# Altium footprint library PCBLIB.PcbLib: 557 footprints (part 33 of 36)
Each footprint in its own frame and in the unit in brackets; x right, y up, seen from the top. Pads: shape width x height; smd on the part's side, far side on the other; paste and mask are expansions set on the pad; w line width, h text height; cw(c..) or ccw(c..) is an arc to the next point about the centre after c.
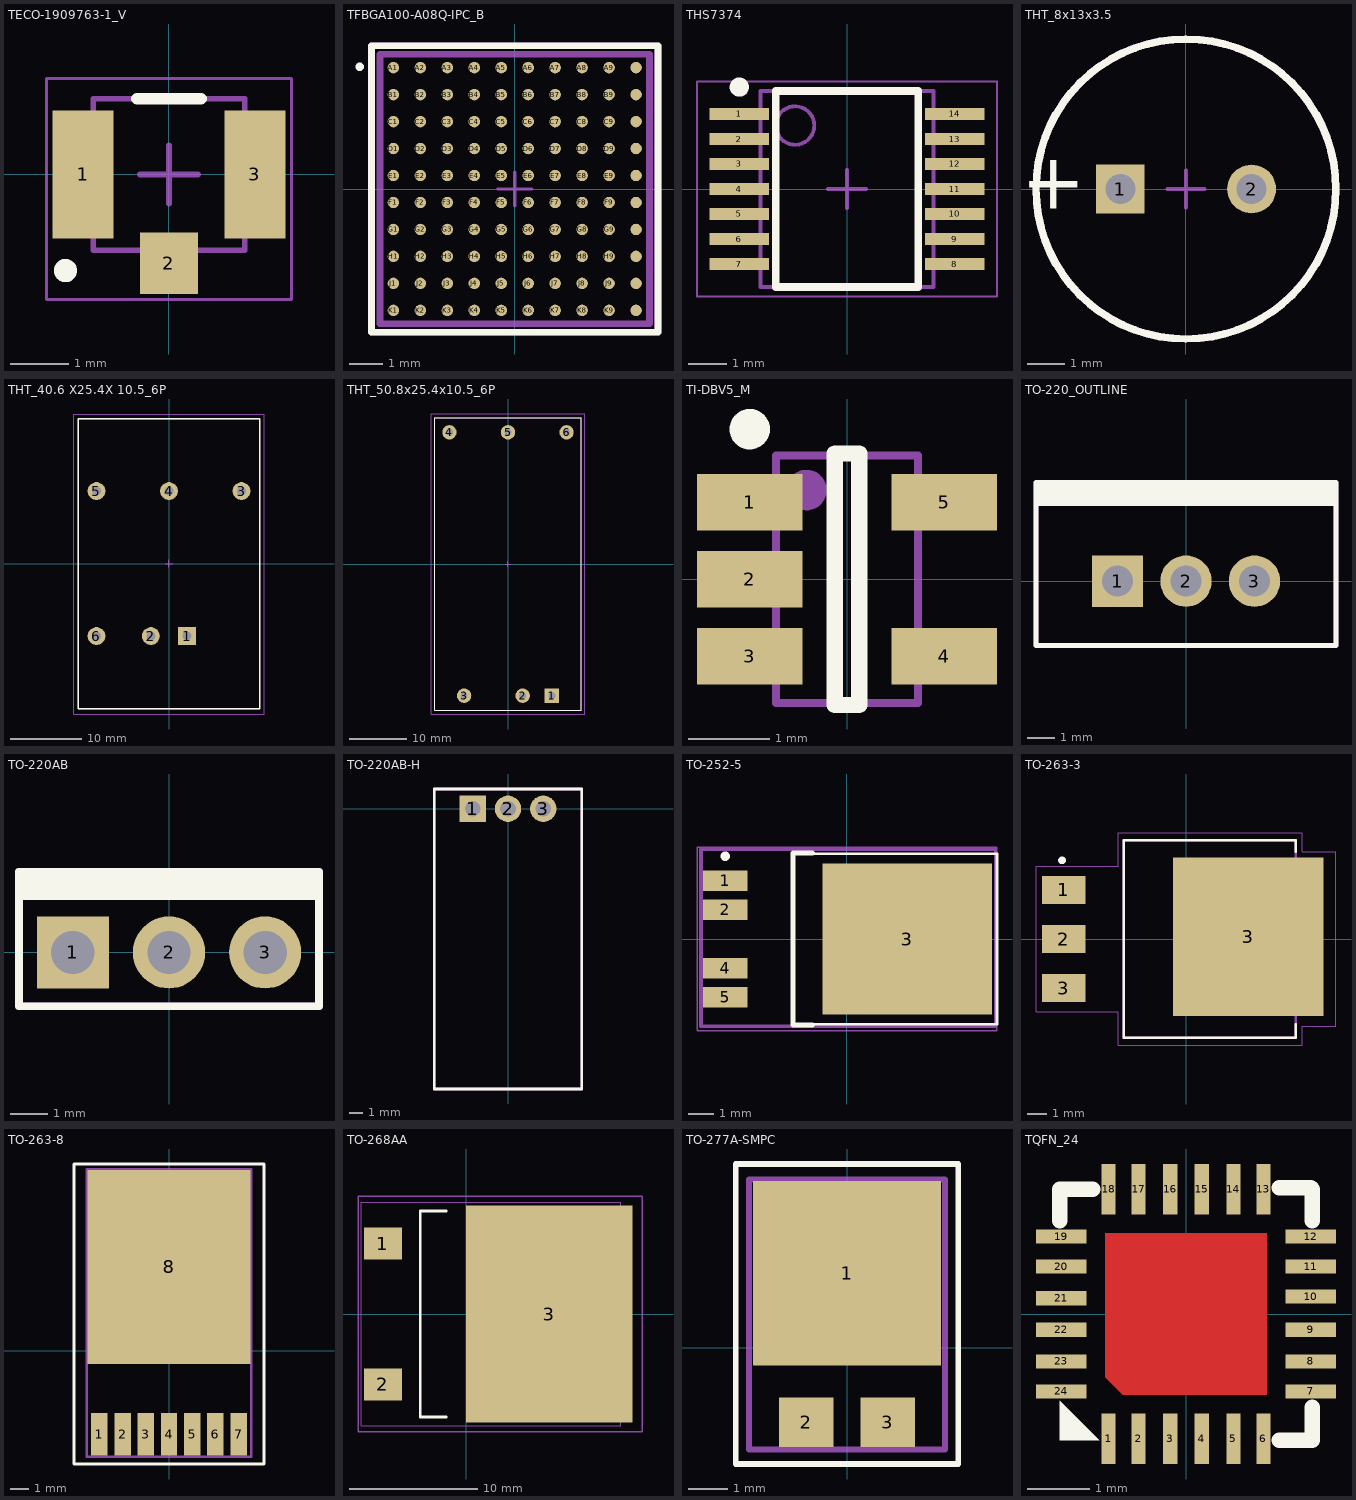
[diagram p32: the footprints below, top view; thin cyan lines are the x and y axes]

## TECO-1909763-1_V [mm] "SMD, 3-Leads, Body 2.6x2.6mm, Height 1.25mm"
height 1.25
pads (3):
  rect 1.05x2.2 smd: 1(-1.475,0) 3(1.475,0)
  rect 1x1.05 smd: 2(0,-1.525)
Top Overlay:
  circle w0.2: c-1.778,-1.65 r0.1
  lines w0.2: -0.55,1.3 0.55,1.3
Mechanical 15:
  lines w0.05: -2.1,-2.15 -2.1,1.65 2.1,1.65 2.1,-2.15 -2.1,-2.15
  lines w0.1: -0.5,0 0.5,0 ; 0,-0.5 0,0.5
ASM Top:
  lines w0.1: -1.3,-1.3 1.3,-1.3 1.3,1.3 -1.3,1.3 -1.3,-1.3
  text ".designator" at 0,0 h0.8
3D body "c-1909763-1-b-3d.stp": height 1.23, standoff 0, extent -1.5,-1.55 1.5,1.55

## TFBGA100-A08Q-IPC_B [mm]
pads (100):
  round 0.34 smd paste+0 mask+0.03: A1(-3.6,3.6) A2(-2.8,3.6) A3(-2,3.6) A4(-1.2,3.6) A5(-0.4,3.6) A6(0.4,3.6) A7(1.2,3.6) A8(2,3.6) A9(2.8,3.6) A10(3.6,3.6) B1(-3.6,2.8) B2(-2.8,2.8) B3(-2,2.8) B4(-1.2,2.8) B5(-0.4,2.8) B6(0.4,2.8) B7(1.2,2.8) B8(2,2.8) B9(2.8,2.8) B10(3.6,2.8) C1(-3.6,2) C2(-2.8,2) C3(-2,2) C4(-1.2,2) C5(-0.4,2) C6(0.4,2) C7(1.2,2) C8(2,2) C9(2.8,2) C10(3.6,2) D1(-3.6,1.2) D2(-2.8,1.2) D3(-2,1.2) D4(-1.2,1.2) D5(-0.4,1.2) D6(0.4,1.2) D7(1.2,1.2) D8(2,1.2) D9(2.8,1.2) D10(3.6,1.2) E1(-3.6,0.4) E2(-2.8,0.4) E3(-2,0.4) E4(-1.2,0.4) E5(-0.4,0.4) E6(0.4,0.4) E7(1.2,0.4) E8(2,0.4) E9(2.8,0.4) E10(3.6,0.4) F1(-3.6,-0.4) F2(-2.8,-0.4) F3(-2,-0.4) F4(-1.2,-0.4) F5(-0.4,-0.4) F6(0.4,-0.4) F7(1.2,-0.4) F8(2,-0.4) F9(2.8,-0.4) F10(3.6,-0.4) G1(-3.6,-1.2) G2(-2.8,-1.2) G3(-2,-1.2) G4(-1.2,-1.2) G5(-0.4,-1.2) G6(0.4,-1.2) G7(1.2,-1.2) G8(2,-1.2) G9(2.8,-1.2) G10(3.6,-1.2) H1(-3.6,-2) H2(-2.8,-2) H3(-2,-2) H4(-1.2,-2) H5(-0.4,-2) H6(0.4,-2) H7(1.2,-2) H8(2,-2) H9(2.8,-2) H10(3.6,-2) J1(-3.6,-2.8) J2(-2.8,-2.8) J3(-2,-2.8) J4(-1.2,-2.8) J5(-0.4,-2.8) J6(0.4,-2.8) J7(1.2,-2.8) J8(2,-2.8) J9(2.8,-2.8) J10(3.6,-2.8) K1(-3.6,-3.6) K2(-2.8,-3.6) K3(-2,-3.6) K4(-1.2,-3.6) K5(-0.4,-3.6) K6(0.4,-3.6) K7(1.2,-3.6) K8(2,-3.6) K9(2.8,-3.6) K10(3.6,-3.6)
Top Overlay:
  circle w0.15: c-4.6,3.625 r0.05
  lines w0.2: -4.25,-4.25 4.25,-4.25 4.25,4.25 -4.25,4.25 -4.25,-4.25
Mechanical 15:
  lines w0.1: -0.5,0 0.5,0 ; 0,-0.5 0,0.5
  lines w0.2: -4.25,-4.25 4.25,-4.25 4.25,4.25 -4.25,4.25 -4.25,-4.25
ASM Top:
  lines w0.2: -4,-4 4,-4 4,4 -4,4 -4,-4
  text ".designator" at 0,0.188 h0.8
3D body "IC_STMicroelectronics_STM32H743VIH6_eec.STEP": height 1.1, standoff 0.3, extent -3.999,-4 4.001,4

## THS7374 [mm] "TSOP, 14-Leads, Body 5,00x4,40mm, Pitch 0,65mm, IPC Medium Density"
height 1.2
pads (14):
  rect 1.55x0.3 smd: 1(-2.8,1.95) 2(-2.8,1.3) 3(-2.8,0.65) 4(-2.8,0) 5(-2.8,-0.65) 6(-2.8,-1.3) 7(-2.8,-1.95) 8(2.8,-1.95) 9(2.8,-1.3) 10(2.8,-0.65) 11(2.8,0) 12(2.8,0.65) 13(2.8,1.3) 14(2.8,1.95)
Top Overlay:
  circle w0.25: c-2.8,2.65 r0.125
  lines w0.2: -1.85,-2.55 1.85,-2.55 1.85,2.55 -1.85,2.55 -1.85,-2.55
Mechanical 15:
  lines w0.05: -3.9,-2.8 3.9,-2.8 3.9,2.8 -3.9,2.8 -3.9,-2.8
  lines w0.1: -0.5,0 0.5,0 ; 0,-0.5 0,0.5
ASM Top:
  circle w0.1: c-1.35,1.65 r0.5
  lines w0.1: -2.25,-2.55 2.25,-2.55 2.25,2.55 -2.25,2.55 -2.25,-2.55
  text ".designator" at -2.025,-0.15 h0.8
3D body "THS7374.step": height 1.2, standoff 0, extent -3.2,-2.55 3.2,2.55

## THT_8x13x3.5 [mm]
height 13
pads (2):
  rect 1.3x1.3 hole 0.8: 1(-1.75,0)
  round 1.3 hole 0.8: 2(1.75,0)
Top Overlay:
  circle w0.2: c0,0 r4
  text "+" at -2.667,0.762 h1.5
Mechanical 13:
  circle w0.05: c0,0 r4
Mechanical 15:
  circle w0.05: c0,0 r4
  lines w0.1: -0.5,0 0.5,0 ; 0,-0.5 0,0.5
ASM Top:
  circle w0.2: c0,0 r4
  text "+" at -2.667,0.762 h1.5
  text ".designator" at -2.3,-0.4 h0.8
3D body "8x16x3.5x0.5.stp": height 16.31, standoff -19.91, extent -4,-3.999 3.99,4

## THT_40.6 X25.4X 10.5_6P [mm]
height 10.5
pads (6):
  rect 2.5x2.5 hole 1.25: 1(2.54,-10.16)
  round 2.5 hole 1.25: 2(-2.54,-10.16) 3(10.16,10.16) 4(0,10.16) 5(-10.16,10.16) 6(-10.16,-10.16)
Top Overlay:
  lines w0.2: -12.7,-20.32 12.7,-20.32 12.7,20.32 -12.7,20.32 -12.7,-20.32
Mechanical 13:
  lines w0.127: -12.7,-20.32 -12.7,20.32 12.7,20.32 12.7,-20.32 -12.7,-20.32
Mechanical 15:
  lines w0.127: -0.5,0 0.5,0 ; 0,-0.5 0,0.5 ; -13.335,-21.082 13.335,-21.082 13.335,20.955 -13.335,20.955 -13.335,-21.082
ASM Top:
  lines w0.127: -12.7,-20.32 12.7,-20.32 12.7,20.32 -12.7,20.32 -12.7,-20.32
  text ".designator" at -0.199,0 h0.8
3D body "JTD15.STEP": height 11, standoff -5.9, extent -12.7,-20.32 12.7,20.32

## THT_50.8x25.4x10.5_6P [mm]
height 10.5
pads (6):
  rect 2.5x2.5 hole 1.25: 1(7.62,-22.86)
  round 2.5 hole 1.25: 2(2.54,-22.86) 3(-7.62,-22.86) 4(-10.16,22.86) 5(0,22.86) 6(10.16,22.86)
Top Overlay:
  lines w0.2: -12.7,-25.4 -12.7,25.4 12.7,25.4 12.7,-25.4 -12.7,-25.4
Mechanical 13:
  lines w0.127: -12.7,-25.4 12.7,-25.4 12.7,25.4 -12.7,25.4 -12.7,-25.4
Mechanical 15:
  lines w0.127: -0.5,0 0.5,0 ; 0,-0.5 0,0.5 ; -13.335,-26.035 -13.335,26.035 13.335,26.035 13.335,-26.035 -13.335,-26.035
ASM Top:
  lines w0.2: -12.7,-25.4 12.7,-25.4 12.7,25.4 -12.7,25.4 -12.7,-25.4
  text ".designator" at -1.1,-0.4 h0.8
3D body "THT_50.8x25.4x10.5_6P.step": height 11.8, standoff -4.1, extent -12.7,-25.4 12.7,25.4

## TI-DBV5_M [mm] "SOT23, 5-Leads, Body 2.9x1.6mm, Pitch 0.95mm, IPC Low Density"
height 1.45
pads (5):
  rect 1.3x0.7 smd: 1(-1.2,0.95) 2(-1.2,0) 3(-1.2,-0.95) 4(1.2,-0.95) 5(1.2,0.95)
Top Overlay:
  circle w0.25: c-1.2,1.85 r0.125
  lines w0.2: -0.15,-1.55 0.15,-1.55 0.15,1.55 -0.15,1.55 -0.15,-1.55
ASM Top:
  circle w0.25: c-0.5,1.1 r0.125
  lines w0.1: -0.875,-1.525 0.875,-1.525 0.875,1.525 -0.875,1.525 -0.875,-1.525
  text ".designator" at 0,0 h0.8
3D body "SOT23-5-2.STEP": height 1.45, standoff 0, extent -1.4,-1.45 1.4,1.45

## TO-220_OUTLINE [mil]
pads (3):
  rect 75x75 hole 45 mask+0: 1(-100,0)
  round 75 hole 45 mask+0: 2(0,0) 3(100,0)
Top Overlay:
  region: -219,144 -219,110 219,110 219,144
  lines w8: -219,-94 -219,144 219,144 219,-94 -219,-94
ASM Top:
  lines w8: -219,-94 -219,144 219,144 219,-94 -219,-94
  text ".designator" at -132,-32 h31.5
3D body "User Library-TO-220AB.STEP": height 781.26, standoff -158.11, extent -211.04,-84 209.04,106.16

## TO-220AB [mil]
pads (3):
  rect 75x75 hole 45 mask+0: 1(-100,0)
  round 75 hole 45 mask+0: 2(0,0) 3(100,0)
Top Overlay:
  region: -156,84 -156,55 156,55 156,84
  lines w8: -156,-56 156,-56 156,84 -156,84 -156,-56
ASM Top:
  region: -156,56
  lines w8: -156,-56 156,-56 156,84 -156,84 -156,-56
  text ".designator" at -132,-33 h31.5
3D body "User Library-TO-220AB.STEP": height 781.26, standoff -158.11, extent -210.08,-85 210,105.16

## TO-220AB-H [mil]
pads (3):
  rect 75x75 hole 45 mask+0: 1(-100,0)
  round 75 hole 45 mask+0: 2(0,0) 3(100,0)
Top Overlay:
  lines w8: -209,-795 209,-795 209,56 -209,56 -209,-795
ASM Top:
  lines w8: -209,-795 209,-795 209,56 -209,56 -209,-795
  text ".designator" at 17,-682 h31.5
3D body "User Library-TO220-AB-H Full.STEP": height 175.99, standoff -281.88, extent -194.76,-780.77 195,15

## TO-252-5 [mm] "DPAK, 5-Leads, Body 6.5x6.12mm, Pitch 1.14mm, IPC Medium Density"
height 2.35
pads (5):
  rect 1.75x0.8 smd: 1(-4.75,2.28) 2(-4.75,1.14) 4(-4.75,-1.14) 5(-4.75,-2.28)
  rect 6.6x5.9 smd: 3(2.35,0)
Top Overlay:
  circle w0.25: c-4.75,3.23 r0.058
  lines w0.1: -2.1,-3.325 -2.1,3.325 5.85,3.325 5.85,-3.325 -2.1,-3.325
  lines w0.2: -1.35,-3.35 -2.1,-3.35 -2.1,3.35 -1.35,3.35
Mechanical 15:
  lines w0.05: -5.85,-3.575 -5.85,3.575 5.85,3.575 5.85,-3.575 -5.85,-3.575
  lines w0.1: -0.5,0 0.5,0 ; 0,-0.5 0,0.5
ASM Top:
  lines w0.15: -5.7,-3.4 5.8,-3.4 5.8,3.5 -5.7,3.5 -5.7,-3.4
  text ".designator" at -0.6,-0.1 h1.2
3D body "User Library-PG-TO252-5-11-1.STEP": height 2.3, standoff 0, extent -4.8,-3.25 5.1,3.25

## TO-263-3 [mm]
pads (4):
  rect 2.25x1.44 smd: 1(-6.31,2.54) 2(-6.31,0) 3(-6.31,-2.54)
  rect 7.79x8.19 smd paste-10: 3(3.213,0.127)
Top Overlay:
  circle w0.2: c-6.402,4.064 r0.1
  lines w0.127: 5.664,-4.4 5.664,-5.112 -3.226,-5.112 -3.226,5.112 5.664,5.112 5.664,4.5
Top Paste:
  rectangle: 4.8,-3.825 6.8,-1.35
  rectangle: 2.262,-3.825 4.262,-1.35
  rectangle: -0.275,-3.825 1.725,-1.35
  rectangle: 4.8,-1.088 6.8,1.387
  rectangle: 2.262,-1.088 4.262,1.387
  rectangle: -0.275,-1.088 1.725,1.387
  rectangle: 4.8,1.65 6.8,4.125
  rectangle: 2.262,1.65 4.262,4.125
  rectangle: -0.275,1.65 1.725,4.125
Mechanical 15:
  lines w0.05: -7.75,-3.75 -3.5,-3.75 -3.5,-5.5 6,-5.5 6,-4.5 7.75,-4.5 7.75,4.5 6,4.5 6,5.5 -3.5,5.5 -3.5,3.75 -7.75,3.75 -7.75,-3.75
ASM Top:
  lines w0.127: -3.226,-5.112 5.664,-5.112 5.664,5.112 -3.226,5.112 -3.226,-5.112
  text ".designator" at -0.175,-0.375 h1.2
3D body "User Library-D²PAK TO-263-3.STEP": height 4.87, standoff 0, extent -7.116,-5.08 7.114,5.08

## TO-263-8 [mm]
pads (8):
  rect 0.9x2.3 smd: 1(-3.81,-4.575) 2(-2.54,-4.575) 3(-1.27,-4.575) 4(0,-4.575) 5(1.27,-4.575) 6(2.54,-4.575) 7(3.81,-4.575)
  rect 8.9x10.6 smd: 8(0,4.575)
Top Overlay:
  lines w0.15: -5.2,-6.2 -5.2,10.1 -5.2,10.2 5.2,10.2 5.2,-6.2 -5.2,-6.2
ASM Top:
  lines w0.15: -4.5,-5.8 4.5,-5.8 4.5,9.9 -4.5,9.9 -4.5,-5.8
  text ".designator" at 0,0 h0.8
3D body "KTW7.step": height 1.77, standoff 0.01, extent -5.207,-4.623 5.207,9.4

## TO-268AA [mm] "D3-PAK, 3-Pads, Body 10.10x11.39mm (max), IPC Medium Density"
height 5.1
pads (3):
  rect 3x2.5 smd: 1(-6.5,5.5) 2(-6.5,-5.5)
  rect 13x17 smd: 3(6.5,0)
Top Overlay:
  lines w0.2: -1.55,-8.05 -3.6,-8.05 -3.6,8.05 -1.55,8.05
Mechanical 15:
  lines w0.05: -8.2,-8.75 12.1,-8.75 12.1,8.75 -8.2,8.75 -8.2,-8.75
  lines w0.1: 1.45,0 2.45,0 ; 1.95,-0.5 1.95,0.5
ASM Top:
  lines w0.1: -8.45,-9.2 13.75,-9.2 13.75,9.2 -8.45,9.2 -8.45,-9.2
  text ".designator" at -1.375,-1.925 h1.2
3D body "User Library-TO545P1905X510_HS-3.step": height 5.1, standoff 0, extent -6.95,-7.901 12.1,8.101

## TO-277A-SMPC [mil]
pads (3):
  rect 189x186 smd: 1(0,75)
  rect 55x50 smd: 2(-41,-75) 3(41,-75)
Top Overlay:
  lines w6: -112,-117 -112,185 112,185 112,-117 -112,-117
ASM Top:
  lines w6: -98.43,-102.36 -98.43,169.29 98.43,169.29 98.43,-102.36 -98.43,-102.36
  text ".designator" at -19.68,0 h31.5
3D body "TO-277A(SMPC).STEP": height 47.24, standoff -0.04, extent -94.01,-97 93,164.81

## TQFN_24 [mil]
pads (24):
  rect 9x32 smd mask+0: 1(-49,-79) 2(-30,-79) 3(-10,-79) 4(10,-79) 5(30,-79) 6(49,-79) 13(49,79) 14(30,79) 15(10,79) 16(-10,79) 17(-30,79) 18(-49,79)
  rect 32x9 smd mask+0: 7(79,-49) 8(79,-30) 9(79,-10) 10(79,11) 11(79,30) 12(79,49) 19(-79,49) 20(-79,30) 21(-79,10) 22(-79,-10) 23(-79,-30) 24(-79,-49)
Top Layer:
  region: 51,51 -51,51 -51,-40 -40,-51 51,-51
Top Overlay:
  region: -80,-55 -80,-80 -55,-80
  lines w10: -80,59 -80,79 -59,79 ; 59,-80 80,-80 80,-59 ; 59,80 79,80 80,79 80,59